# Altium footprint library Electronic Devices_LIB.PcbLib: 410 footprints (part 23 of 26)
Each footprint in its own frame and in the unit in brackets; x right, y up, seen from the top. Pads: shape width x height; smd on the part's side, far side on the other; paste and mask are expansions set on the pad; w line width, h text height; cw(c..) or ccw(c..) is an arc to the next point about the centre after c.
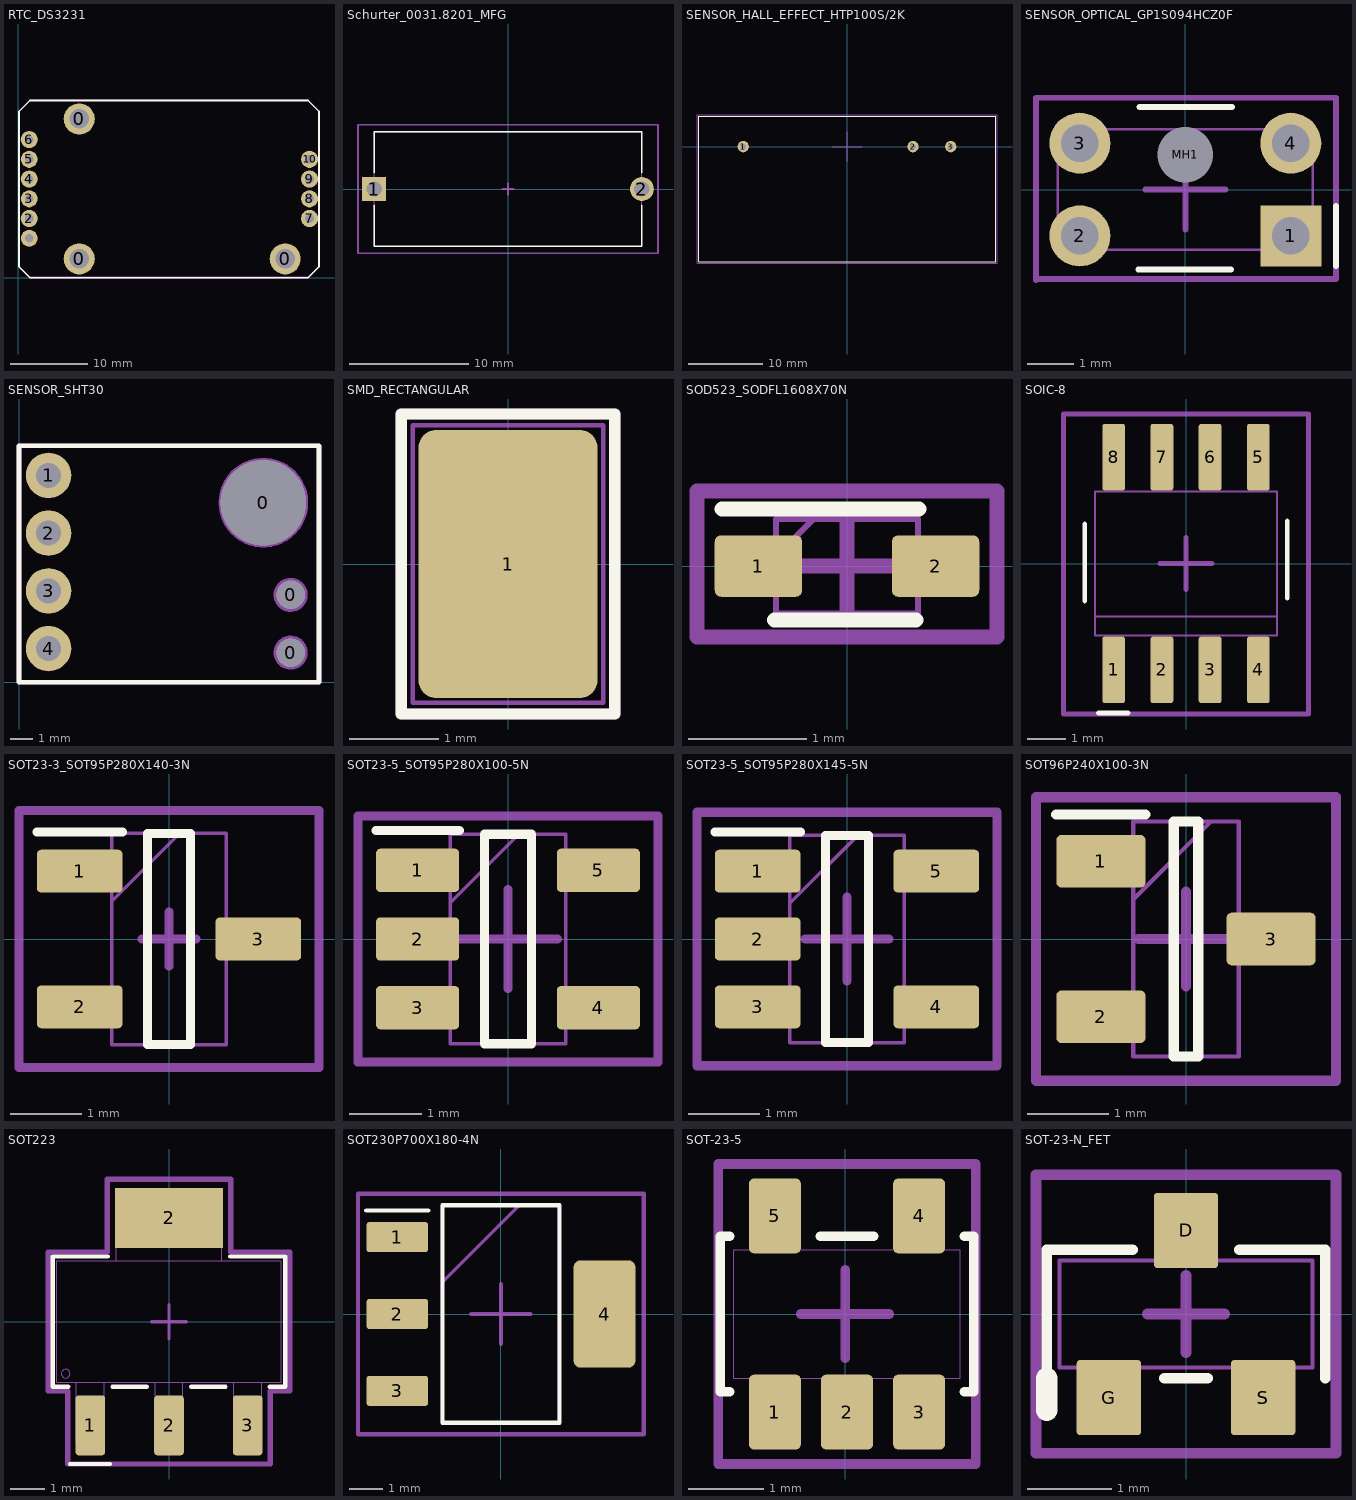
[diagram p22: the footprints below, top view; thin cyan lines are the x and y axes]

## RTC_DS3231 [mm]
pads (13):
  round 4 hole 2.5: 0(7.85,2.4) 0(7.85,20.4) 0(34.35,2.4)
  round 2.2 hole 1.1: 2(1.42,7.59) 3(1.42,10.13) 4(1.42,12.67) 5(1.42,15.21) 6(1.42,17.75) 7(37.48,7.59) 8(37.48,10.13) 9(37.48,12.67) 10(37.48,15.21) ""(1.42,5.05)
Top Overlay:
  lines w0.2: 0.1,1.375 0.1,21.375 1.5,22.775 1.6,22.775 37.3,22.775 38.7,21.375 38.7,2.475 38.7,1.375 37.3,-0.025 1.5,-0.025 0.1,1.375
Top Assembly:
  circle w0.2: c34.35,2.4 r1
  circle w0.2: c7.85,2.4 r1
  circle w0.2: c7.85,20.4 r1
  circle w0.2: c37.48,7.59 r0.75
  circle w0.2: c37.48,10.13 r0.75
  circle w0.2: c37.48,12.67 r0.75
  circle w0.2: c37.48,15.21 r0.75
  lines w0.2: 0.1,1.4 0.1,21.4 1.5,22.8 1.6,22.8 37.3,22.8 38.7,21.4 38.7,2.5 38.7,1.4 37.3,0 1.5,0 0.1,1.4
3D body "4-Pin Header - Male - 2.54mm.step": height 5.75, standoff -6.19, extent 36.195,6.299 38.735,16.459
3D body "DS3231 RTC.step": height 12.11, standoff -1.42, extent -5.964,0.025 38.786,22.825

## Schurter_0031.8201_MFG [mm]
pads (2):
  rect 2x2 hole 1.3 paste-1000: 1(-11.25,0)
  round 2 hole 1.3 paste-1000: 2(11.25,0)
Top Overlay:
  lines w0.127: -11.25,-1.375 -11.25,-4.8 11.25,-4.8 11.25,-1.375 ; -11.25,1.375 -11.25,4.8 11.25,4.8 11.25,1.375
Top Assembly:
  lines w0.051: -11.25,-4.8 11.25,-4.8 11.25,4.8 -11.25,4.8 -11.25,-4.8
  text ".Designator" at -2.261,-0.085 h0.51
Top Courtyard:
  lines w0.127: -0.5,0 0.5,0 ; 0,-0.5 0,0.5 ; -12.6,-5.4 12.6,-5.4 12.6,5.4 -12.6,5.4 -12.6,-5.4
3D body "Fuse_Schurter_0031.8201_eec.STEP": height 0.25, standoff 0, extent -12.6,-5.4 12.6,5.4

## SENSOR_HALL_EFFECT_HTP100S/2K [mil]
height 1171.26
pads (4):
  round 60 hole 30: 1(-550,0) 1(-550,0) 2(350,0) 3(550,0)
Top Overlay:
  lines w5: -786.22,-610.24 788.58,-610.24 788.58,161.42 -786.22,161.42 -786.22,-610.24
Top Courtyard:
  lines w5: -78.74,0 0,0 ; 0,-78.74 0,0 ; 0,78.74 0,0 ; 78.74,0 0,0 ; -795.28,-618.11 795.28,-618.11 795.28,169.29 -795.28,169.29 -795.28,-618.11

## SENSOR_OPTICAL_GP1S094HCZ0F [mm] "Through Hole, 4.55 pitch"
height 7.9
pads (5):
  rect 1.316x1.316 hole 0.81: 1(2.275,-1)
  round 1.316 hole 0.81: 2(-2.275,-1) 3(-2.275,1) 4(2.275,1)
  round 0.6 hole 1.2 unplated: MH1(0,0.75)
Top Overlay:
  lines w0.127: -1.016,-1.727 0.984,-1.727 ; -0.991,1.778 1.009,1.778 ; 3.251,-1.651 3.251,-0.356
Top Assembly:
  lines w0.051: -2.75,-1.3 -2.75,1.3 2.75,1.3 2.75,-1.3 -2.75,-1.3
  text ".Designator" at -2.475,-0.152 h0.51
Top Courtyard:
  lines w0.127: -3.222,-1.956 -3.222,-0.978 -3.222,0.978 -3.222,1.956 ; -3.222,-1.93 3.251,-1.93 3.251,1.981 -3.222,1.981 ; -0.864,0 0,0 ; 0,-0.864 0,0 ; 0,0.864 0,0 ; 0.864,0 0,0
3D body "GP1S094HCZ0F.stp": height 4.85, standoff -3.95, extent -2.745,-1.3 2.755,1.3

## SENSOR_SHT30 [mm]
pads (7):
  round 3.75 hole 3.75: 0(10.75,7.9)
  round 1.25 hole 1.25: 0(11.95,1.3) 0(11.95,3.84)
  round 2 hole 1.1: 1(1.3,9.1) 2(1.3,6.56) 3(1.3,4.02) 4(1.3,1.48)
Top Overlay:
  lines w0.2: 0,0 13.2,0 13.2,1.2 13.2,10.4 0,10.4 0,0
Mechanical 1:
  circle w0.2: c11.95,1.3 r0.65
  circle w0.2: c11.95,3.84 r0.651
  circle w0.2: c1.3,1.48 r0.875
  circle w0.2: c1.3,4.02 r0.875
  circle w0.2: c1.3,6.56 r0.875
  circle w0.2: c1.3,9.1 r0.875
  circle w0.2: c10.75,7.9 r1.875
  lines w0.2: 0,0 0,10.4 13.2,10.4 13.2,1.2 13.2,0 0,0
3D body "SHT30 Purple.step": height 4.9, standoff 1.94, extent 0,0 13.25,10.4
3D body "4-Pin Header - Male - 2.54mm.step": height 5.65, standoff -6.29, extent 0.025,0.127 2.565,10.287

## SMD_RECTANGULAR [mm] "3X4 MM PAD RECTANGULAR"
pads (1):
  rrect20% 2x3 smd mask+0.076: 1(0,0)
Top Overlay:
  lines w0.127: -1.194,-1.676 1.194,-1.676 1.194,-0.102 1.194,1.676 -1.194,1.676 -1.194,-1.676
Top Assembly:
  lines w0.051: -1.067,-1.549 -1.067,1.549 1.067,1.549 1.067,-1.549 -1.067,-1.549
  text ".Designator" at -2.515,-0.161 h0.51
Top Courtyard:
  lines w0.127: -0.914,0 0,0 ; 0,-0.914 0,0 ; 0,0.914 0,0 ; 0.914,0 0,0 ; -1.194,-1.676 1.194,-1.676 1.194,-0.102 1.194,1.676 -1.194,1.676 -1.194,-1.676

## SOD523_SODFL1608X70N [mm]
pads (2):
  rrect20% 0.74x0.52 smd: 1(-0.75,0) 2(0.75,0)
Top Overlay:
  lines w0.127: -1.06,0.483 0.61,0.483 ; -0.616,-0.457 0.584,-0.457
Top Assembly:
  lines w0.051: -0.6,0.08 -0.28,0.4 ; -0.6,-0.4 0.6,-0.4 0.6,0.4 -0.6,0.4 -0.6,-0.4
Top Courtyard:
  lines w0.127: -0.4,0 0,0 ; 0,-0.4 0,0 ; 0,0.4 0,0 ; 0.4,0 0,0 ; -1.27,-0.6 1.27,-0.6 1.27,0.635 -1.27,0.635 -1.27,-0.6
3D body "ESD5Z5.0T1G.stp": height 0.7, standoff 0, extent -0.8,-0.4 0.8,0.4

## SOIC-8 [mm]
pads (8):
  rrect20% 0.6x1.75 smd: 1(-1.905,-2.8) 2(-0.635,-2.8) 3(0.635,-2.8) 4(1.905,-2.8) 5(1.905,2.8) 6(0.635,2.8) 7(-0.635,2.8) 8(-1.905,2.8)
Top Overlay:
  lines w0.127: -2.667,-0.991 -2.667,1.041 ; -2.311,-3.937 -1.524,-3.937 ; 2.667,-0.914 2.667,1.118
Top Assembly:
  lines w0.051: -2.4,-1.4 2.4,-1.4 ; -2.4,-1.4 -2.4,1.9 2.4,1.9 2.4,-1.4 ; -2.4,-1.4 -2.4,-1.9 2.4,-1.9 2.4,-1.4
  text ".Designator" at -2.616,-0.263 h0.51
Top Courtyard:
  lines w0.127: -0.686,0 0,0 ; 0,-0.686 0,0 ; 0,0.686 0,0 ; 0.686,0 0,0 ; -3.226,-3.962 3.226,-3.962 3.226,3.937 -3.226,3.937 -3.226,-3.962
3D body "step_temp.STEP": height 1.75, standoff 0, extent -2.45,-3 2.45,3

## SOT23-3_SOT95P280X140-3N [mm] "SOT23-3"
height 1.4
pads (3):
  rrect20% 1.2x0.6 smd: 1(-1.25,0.95) 2(-1.25,-0.95) 3(1.25,0)
Top Overlay:
  lines w0.127: -1.85,1.5 -0.65,1.5 ; -0.3,-1.48 -0.3,1.48 0.3,1.48 0.3,-1.48 -0.3,-1.48
Top Assembly:
  lines w0.051: -0.8,0.53 0.15,1.48 ; -0.8,-1.48 -0.8,1.48 0.8,1.48 0.8,-1.48 -0.8,-1.48
  text ".Designator" at -2.413,-0.136 h0.51
Top Courtyard:
  lines w0.127: -0.381,0 0,0 ; 0,-0.381 0,0 ; 0,0.381 0,0 ; 0.381,0 0,0 ; -2.1,-1.8 -2.1,1.8 2.1,1.8 2.1,-1.8 -2.1,-1.8
3D body "UM803RS.stp": height 1.4, standoff 0, extent -1.4,-1.48 1.4,1.48

## SOT23-5_SOT95P280X100-5N [mm]
pads (5):
  rrect20% 1.15x0.6 smd: 1(-1.25,0.95) 2(-1.25,0) 3(-1.25,-0.95) 4(1.25,-0.95) 5(1.25,0.95)
Top Overlay:
  lines w0.127: -1.825,1.5 -0.675,1.5 ; -0.325,-1.45 0.325,-1.45 0.325,1.45 -0.325,1.45 -0.325,-1.45
Top Assembly:
  lines w0.051: -0.8,0.5 0.15,1.45 ; -0.8,-1.45 0.8,-1.45 0.8,1.45 -0.8,1.45 -0.8,-1.45
  text ".Designator" at -2.413,-0.212 h0.51
Top Courtyard:
  lines w0.127: -0.686,0 0,0 ; 0,-0.686 0,0 ; 0,0.686 0,0 ; 0.686,0 0,0 ; -2.075,-1.7 2.075,-1.7 2.075,1.7 -2.075,1.7 -2.075,-1.7
3D body "ADP123AUJZ-R7.stp": height 1, standoff 0, extent -1.4,-1.45 1.4,1.45

## SOT23-5_SOT95P280X145-5N [mm]
pads (5):
  rrect20% 1.2x0.6 smd: 1(-1.25,0.95) 2(-1.25,0) 3(-1.25,-0.95) 4(1.25,-0.95) 5(1.25,0.95)
Top Overlay:
  lines w0.127: -1.85,1.5 -0.65,1.5 ; -0.3,-1.45 -0.3,1.45 0.3,1.45 0.3,-1.45 -0.3,-1.45
Top Assembly:
  lines w0.051: -0.8,0.5 0.15,1.45 ; -0.8,-1.45 -0.8,1.45 0.8,1.45 0.8,-1.45 -0.8,-1.45
Top Courtyard:
  lines w0.127: -0.584,0 0,0 ; 0,-0.584 0,0 ; 0,0.584 0,0 ; 0.584,0 0,0 ; -2.1,-1.775 -2.1,1.775 2.1,1.775 2.1,-1.775 -2.1,-1.775
3D body "TLV70218DBVR.stp": height 1.2, standoff 0, extent -1.4,-1.45 1.4,1.45

## SOT96P240X100-3N [mm] "TO-236-3, SC-59, SOT-23-3"
height 1.1
pads (3):
  rrect20% 1.1x0.65 smd: 1(-1.05,0.96) 2(-1.05,-0.96) 3(1.05,0)
Top Overlay:
  lines w0.127: -1.6,1.535 -0.5,1.535 ; -0.15,-1.45 0.15,-1.45 0.15,1.45 -0.15,1.45 -0.15,-1.45
Top Assembly:
  lines w0.051: -0.65,0.49 0.31,1.45 ; -0.65,-1.45 -0.65,1.45 0.65,1.45 0.65,-1.45 -0.65,-1.45
  text ".Designator" at -2.616,-0.212 h0.51
Top Courtyard:
  lines w0.127: -0.584,0 0,0 ; 0,-0.584 0,0 ; 0,0.584 0,0 ; 0.584,0 0,0 ; -1.85,-1.75 1.85,-1.75 1.85,1.75 -1.85,1.75 -1.85,-1.75
3D body "APX803S-31SA-7.stp": height 1, standoff 0, extent -1.2,-1.45 1.2,1.45

## SOT223 [mil] "SOT-223-3, TO-261-4, TO-261AA"
height 66.93
pads (4):
  rrect20% 34x69 smd paste+0: 1(-90.55,-119.5) 2(0,-119.5) 3(90.55,-119.5)
  rect 124x69 smd paste+0: 2(0,119.5)
Top Overlay:
  lines w5: -116.01,-75 -134,-75 -134,75 -70.46,75 ; -114,-164 -68,-164 ; -65.09,-75 -25.46,-75 ; 25.46,-75 65.09,-75 ; 70.46,75 134,75 134,-75 116.01,-75
Top Assembly:
  circle w0: c-119,-60 r5
  lines w1: -129,-70 129,-70 129,70 -129,70 -129,-70 ; -106.55,-140 -74.55,-140 -74.55,-70 -106.55,-70 -106.55,-140 ; -61,70 61,70 61,140 -61,140 -61,70 ; -16,-140 16,-140 16,-70 -16,-70 -16,-140 ; 74.55,-140 106.55,-140 106.55,-70 74.55,-70 74.55,-140
  text ".Designator" at -87,-7.34 h20
Top Courtyard:
  lines w3.94: -19.68,0 19.69,0 ; 0,-19.68 0,19.69
  lines w6: -139,-80 -139,80 -71,80 -71,164 71,164 71,80 139,80 139,-80 116.55,-80 116.55,-164 -116.55,-164 -116.55,-80 -139,-80
3D body "SOT223_DIO.step": height 65.12, standoff 0, extent -129.02,-142 129.02,138

## SOT230P700X180-4N [mm]
pads (4):
  rrect20% 1.85x0.9 smd: 1(-3.1,2.3) 2(-3.1,0) 3(-3.1,-2.3)
  rrect20% 1.85x3.2 smd: 4(3.1,0)
Top Overlay:
  lines w0.127: -4.025,3.1 -2.175,3.1 ; -1.75,-3.25 -1.75,3.25 1.75,3.25 1.75,-3.25 -1.75,-3.25
Top Assembly:
  lines w0.1: -1.75,0.95 0.55,3.25 ; -1.75,-3.25 -1.75,3.25 1.75,3.25 1.75,-3.25 -1.75,-3.25
Top Courtyard:
  lines w0.127: -0.889,0 0,0 ; 0,-0.889 0,0 ; 0,0.889 0,0 ; 0.889,0 0,0 ; -4.275,-3.6 -4.275,3.6 4.275,3.6 4.275,-3.6 -4.275,-3.6
3D body "AZ1117IH-3.3TRG1.stp": height 1.8, standoff 0, extent -3.5,-3.25 3.5,3.25

## SOT-23-5 [mil] "SOT-23-5"
pads (5):
  rrect20% 27x39 smd: 1(-36.5,-51) 2(1,-51) 3(38.5,-51) 4(38.5,51) 5(-36.5,51)
Top Overlay:
  lines w5: -60,-40.5 -65,-40.5 -65,40.5 -60,40.5 ; -13,40.5 15,40.5 ; 62,-40.5 67,-40.5 67,40.5 62,40.5
Top Assembly:
  lines w0.01: -58,-33.5 60,-33.5 60,33.5 -58,33.5 -58,-33.5
  text ".Designator" at -99,-5.34 h20
Top Courtyard:
  lines w5: -23,0 0,0 ; 0,-23 0,0 ; 0,23 0,0 ; 23,0 0,0 ; -66,-78 68,-78 68,78 -66,78 -66,-78
3D body "STM6717TGWY6F.STEP": height 57.54, standoff 0.41, extent -57.09,-54.71 57.09,55.55

## SOT-23-N_FET [mil] "SOT-23 FET Normal Density"
height 39.37
pads (3):
  rrect10% 30x35 smd: D(0,39) G(-36,-39) S(36,-39)
Top Overlay:
  lines w5: -65,-30 -65,30 -25,30 ; -10,-30 10,-30 ; 25,30 65,30 65,-30
  lines w10: -65,-45 -65,-30
Top Assembly:
  lines w2: -59.06,-25 59.06,-25 59.06,25 -59.06,25 -59.06,-25
  text ".Designator" at -100,-6.34 h20
Top Courtyard:
  lines w5: -18,0 0,0 ; 0,-18 0,0 ; 0,18 0,0 ; 18,0 0,0 ; -70,-65 -70,65 70,65 70,-65 -70,-65
3D body "SOT-23.step": height 41.65, standoff -1.65, extent -59.06,-51.66 59.06,46.77